# Altium footprint library ICs And Semiconductors THD.PcbLib: 507 footprints (part 27 of 32)
Each footprint in its own frame and in the unit in brackets; x right, y up, seen from the top. Pads: shape width x height; smd on the part's side, far side on the other; paste and mask are expansions set on the pad; w line width, h text height; cw(c..) or ccw(c..) is an arc to the next point about the centre after c.
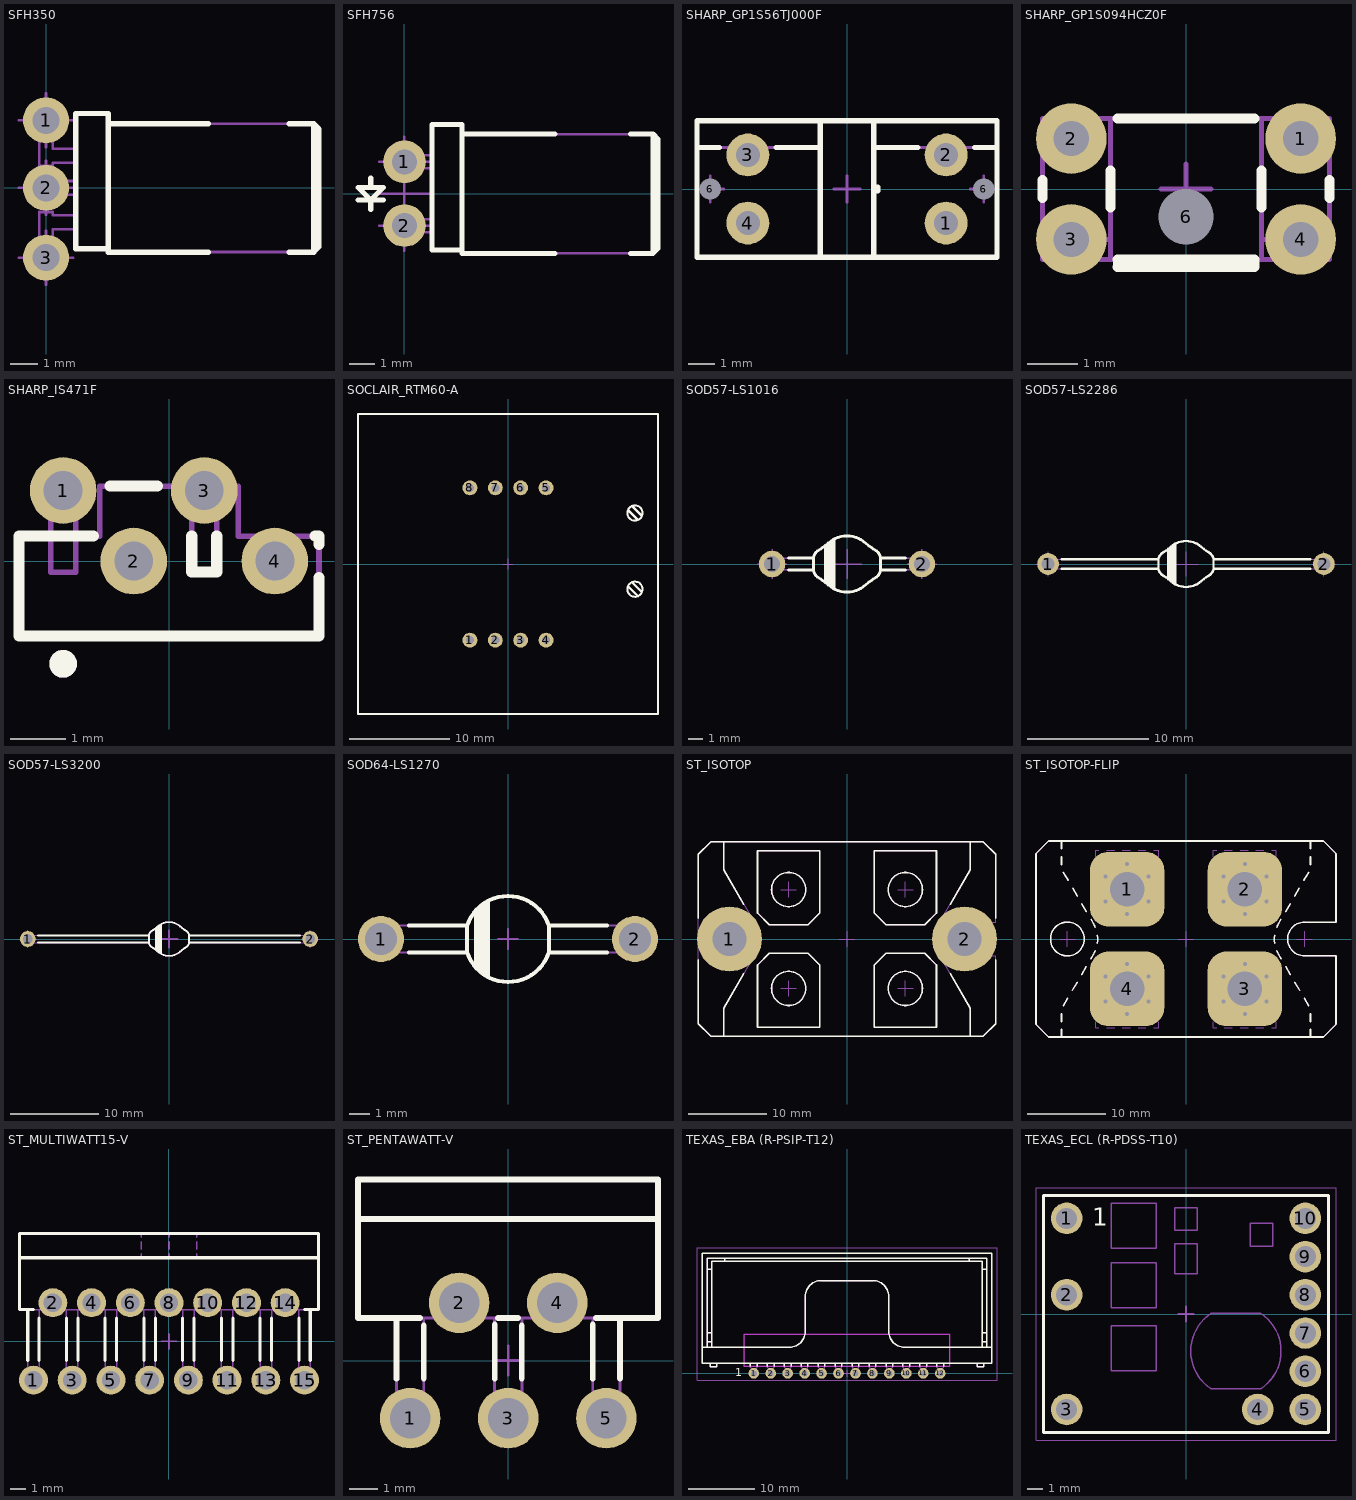
[diagram p26: the footprints below, top view; thin cyan lines are the x and y axes]

## SFH350 [mm] "Fiber Optic Phototransistor Detector"
height 7.55
pads (3):
  round 1.7 hole 1: 1(0,2.498) 2(0,0) 3(0,-2.582)
Top Overlay:
  lines w0.2: 2.3,-2.25 1.1,-2.25 1.1,2.75 2.3,2.75 2.3,-2.375 6,-2.375 ; 2.3,2.375 6,2.375 ; 9,-2.375 9.9,-2.375 ; 9,2.375 9.9,2.375 ; 9.9,-2.375 10.1,-2.175 10.1,2.175 9.9,2.375 ; 9.9,-2.375 9.9,2.375
Notvisible:
  lines w0.1: -1,-2.582 0,-2.582 ; -1,0 0,0 ; -1,2.498 0,2.498 ; 0,-3.582 0,-2.582 ; 0,-1.582 0,-2.582 ; 0,-1 0,0 ; 0,1 0,0 ; 0,1.498 0,2.498 ; 0,3.498 0,2.498 ; 1,-2.582 0,-2.582 ; 1,0 0,0 ; 1,2.498 0,2.498
Mechanical 14:
  lines w0.1: -0.25,-2.326 0.25,-2.326 ; -0.25,-1.526 -0.25,-1.014 ; 1.1,-1.526 0.25,-1.526 0.25,-2.961 -0.25,-2.961 -0.25,-0.891 0.25,-0.891 0.25,-1.014 1.1,-1.014 ; 1.1,-0.256 0.25,-0.256 0.25,-0.379 -0.25,-0.379 -0.25,0.379 0.25,0.379 0.25,0.256 1.1,0.256 ; 1.1,0.93 0.25,0.93 0.25,0.807 -0.25,0.807 -0.25,2.877 0.25,2.877 0.25,1.443 1.1,1.443 ; 2.3,-2.25 1.1,-2.25 1.1,2.75 2.3,2.75 2.3,-2.375 9.9,-2.375 ; 2.3,2.375 9.9,2.375 ; 9.9,-2.375 10.1,-2.175 10.1,2.175 9.9,2.375 ; 9.9,-2.375 9.9,2.375
3D body "SFH350.stp": height 7.54, standoff -3.2, extent -0.25,-2.961 10.1,2.877

## SFH756 [mm] "Fiber Optic Photodiode Detector"
height 7.55
pads (2):
  round 1.7 hole 1: 1(0,1.27) 2(0,-1.27)
Top Overlay:
  lines w0.2: -1.852,-0.254 -0.836,-0.254 ; -1.344,-0.635 -1.344,-0.254 ; -1.344,0.254 -1.344,0.635 ; 2.3,-2.25 1.1,-2.25 1.1,2.75 2.3,2.75 2.3,-2.375 6,-2.375 ; 2.3,2.375 6,2.375 ; 9,-2.375 9.9,-2.375 ; 9,2.375 9.9,2.375 ; -1.344,-0.254 -0.836,0.254 -1.852,0.254 -1.344,-0.254 ; 9.9,-2.375 9.9,2.375 ; 9.9,-2.375 10.1,-2.175 10.1,2.175 9.9,2.375
Notvisible:
  lines w0.1: -1,-1.27 0,-1.27 ; -1,0 0,0 ; -1,1.27 0,1.27 ; 0,-2.27 0,-1.27 ; 0,-1 0,0 ; 0,-0.27 0,-1.27 ; 0,0.27 0,1.27 ; 0,1 0,0 ; 0,2.27 0,1.27 ; 1,-1.27 0,-1.27 ; 1,0 0,0 ; 1,1.27 0,1.27
Mechanical 14:
  lines w0.1: -1.344,-0.635 -1.344,-0.254 ; -1.344,0.254 -1.344,0.635 ; 1.1,-1.526 -0.25,-1.526 -0.25,-1.014 1.1,-1.014 ; 1.1,1.014 -0.25,1.014 -0.25,1.526 1.1,1.526 ; 2.3,-2.25 1.1,-2.25 1.1,2.75 2.3,2.75 2.3,-2.375 9.9,-2.375 ; 2.3,2.375 9.9,2.375 ; -1.852,-0.254 -0.836,-0.254 ; -1.852,-0.254 -0.836,-0.254 ; -1.852,-0.254 -0.836,-0.254 ; -1.852,0.254 -0.836,0.254 ; -1.852,0.254 -1.344,-0.254 ; -1.852,0.254 -1.344,-0.254 ; -1.852,0.254 -0.836,0.254 ; -1.852,0.254 -0.836,0.254 ; -1.852,0.254 -1.344,-0.254 ; -1.344,-0.254 -0.836,0.254 ; -1.344,-0.254 -0.836,0.254 ; -1.344,-0.254 -0.836,0.254 ; 9.9,-2.375 9.9,2.375 ; 9.9,-2.375 10.1,-2.175 10.1,2.175 9.9,2.375
3D body "SFH756.stp": height 7.55, standoff -3.2, extent -0.25,-2.375 10.1,2.75

## SHARP_GP1S56TJ000F [mm] "Gap : 2mm, Slit : 0.15mm Phototransistor Output, Case package Transmissive Photointerrupter"
height 8.2
pads (6):
  round 1.6 hole 0.9: 1(3.7,-1.27) 2(3.7,1.27) 3(-3.7,1.27) 4(-3.7,-1.27)
  round 0.5 hole 0.8 unplated mask+0.15: 6(-5.1,0) 6(5.1,0)
Top Overlay:
  lines w0.2: -5.6,1.55 -4.764,1.55 ; -2.636,1.55 -1,1.55 ; -1,-2.55 -1,2.55 ; 1,-2.55 1,2.55 ; 1,-0.075 1.15,-0.075 1.15,0.075 1,0.075 ; 1,1.55 2.636,1.55 ; 4.764,1.55 5.6,1.55 ; -5.6,-2.55 -5.6,2.55 5.6,2.55 5.6,-2.55 -5.6,-2.55
Notvisible:
  lines w0.1: -5.6,0 -5.1,0 ; -5.1,-0.5 -5.1,0 ; -5.1,0.5 -5.1,0 ; -4.6,0 -5.1,0 ; -4.2,-1.27 -3.7,-1.27 ; -4.2,1.27 -3.7,1.27 ; -3.7,-1.77 -3.7,-1.27 ; -3.7,-0.77 -3.7,-1.27 ; -3.7,0.77 -3.7,1.27 ; -3.7,1.77 -3.7,1.27 ; -3.2,-1.27 -3.7,-1.27 ; -3.2,1.27 -3.7,1.27 ; -0.5,0 0,0 ; 0,-0.5 0,0 ; 0,0.5 0,0 ; 0.5,0 0,0 ; 3.2,-1.27 3.7,-1.27 ; 3.2,1.27 3.7,1.27 ; 3.7,-1.77 3.7,-1.27 ; 3.7,-0.77 3.7,-1.27 ; 3.7,0.77 3.7,1.27 ; 3.7,1.77 3.7,1.27 ; 4.2,-1.27 3.7,-1.27 ; 4.2,1.27 3.7,1.27 ; 4.6,0 5.1,0 ; 5.1,-0.5 5.1,0 ; 5.1,0.5 5.1,0 ; 5.6,0 5.1,0
Mechanical 14:
  lines w0.1: -5.6,1.55 -1,1.55 ; -1,-2.55 -1,2.55 ; 1,-2.55 1,2.55 ; 1,-0.075 1.15,-0.075 1.15,0.075 1,0.075 ; 1,1.55 5.6,1.55 ; -5.6,-2.55 -5.6,2.55 5.6,2.55 5.6,-2.55 -5.6,-2.55
3D body "SHARP_GP1S56TJ000F.stp": height 7.5, standoff -3.6, extent -5.6,-2.55 5.6,2.55

## SHARP_GP1S094HCZ0F [mm] "Gap : 3mm, Slit : 0.3mm Phototransistor Output, Compact Transmissive Photointerrupter"
height 4.8
pads (5):
  round 1.4 hole 0.7: 1(2.275,1) 2(-2.275,1) 3(-2.275,-1) 4(2.275,-1)
  round 0.5 hole 1.1 unplated mask+0.3: 6(0,-0.55)
Top Overlay:
  lines w0.2: -2.85,-0.182 -2.85,0.182 ; -1.358,-1.4 1.358,-1.4 1.358,-1.55 -1.358,-1.55 -1.35,-1.55 -1.35,-1.4 ; 1.5,-0.368 1.5,0.368 ; -1.5,-0.368 -1.5,0.368 -1.5,-0.368 ; -1.358,1.4 1.358,1.4 -1.358,1.4 ; 2.85,-0.182 2.85,0.182 2.85,-0.182
Notvisible:
  lines w0.1: -2.775,-1 -2.275,-1 ; -2.775,1 -2.275,1 ; -2.275,-1.5 -2.275,-1 ; -2.275,-0.5 -2.275,-1 ; -2.275,0.5 -2.275,1 ; -2.275,1.5 -2.275,1 ; -1.775,-1 -2.275,-1 ; -1.775,1 -2.275,1 ; -0.5,-0.55 0,-0.55 ; -0.5,0 0,0 ; 0,-1.05 0,-0.55 ; 0,0.5 0,0 ; 0.5,-0.55 0,-0.55 ; 0.5,0 0,0 ; 1.775,-1 2.275,-1 ; 1.775,1 2.275,1 ; 2.275,-1.5 2.275,-1 ; 2.275,-0.5 2.275,-1 ; 2.275,0.5 2.275,1 ; 2.275,1.5 2.275,1 ; 2.775,-1 2.275,-1 ; 2.775,1 2.275,1
Mechanical 14:
  lines w0.1: -2.85,-1 -1.5,-1 ; 1.5,-1.4 1.5,1.4 ; 1.5,-1 2.85,-1 ; -2.85,-1.4 -2.85,1.4 ; -2.85,-1.4 2.85,-1.4 ; -2.85,-1.4 -2.85,1.4 ; -2.85,-1.4 2.85,-1.4 ; -2.85,1.4 2.85,1.4 ; -2.85,1.4 2.85,1.4 ; 2.85,-1.4 2.85,1.4 ; 2.85,-1.4 2.85,1.4 ; -1.5,-1.4 -1.5,1.4 -1.5,-1.4
3D body "SHARP_GP1S094HCZ0F.stp": height 4.8, standoff -3.2, extent -2.85,-1.4 2.85,1.4

## SHARP_IS471F [mm] "SHARP OPIC Light Detector, 4-Leads, Pitch 1.27mm"
height 8.67
pads (4):
  round 1.2 hole 0.7: 1(-1.905,1.27) 2(-0.635,0) 3(0.635,1.27) 4(1.905,0)
Top Overlay:
  circle w0.25: c-1.905,-1.85 r0.125
  lines w0.2: -1.356,0.45 -2.7,0.45 -2.7,-1.35 2.7,-1.35 2.7,-0.301 ; -1.059,1.35 -0.211,1.35 ; 0.41,0.45 0.41,-0.2 0.86,-0.2 0.86,0.45 ; 2.626,0.45 2.7,0.45 2.7,0.301
Mechanical 14:
  circle w0.25: c-1.905,-1.85 r0.125
  lines w0.1: -2.7,-1.35 2.7,-1.35 2.7,0.45 1.25,0.45 1.25,1.35 -1.25,1.35 -1.25,0.45 -2.7,0.45 -2.7,-1.35 ; -2.13,-0.2 -1.68,-0.2 -1.68,1.47 -2.13,1.47 -2.13,-0.2 ; -0.86,-0.2 -0.41,-0.2 -0.41,0.2 -0.86,0.2 -0.86,-0.2 ; 0.41,-0.2 0.86,-0.2 0.86,1.47 0.41,1.47 0.41,-0.2 ; 1.68,-0.2 2.13,-0.2 2.13,0.2 1.68,0.2 1.68,-0.2
3D body "SHARP_IS471F.stp": height 8.17, standoff -3.35, extent -2.7,-1.35 2.7,1.47

## SOCLAIR_RTM60-A [mm] "SOCLAIR RTM60 Transducer for Pt-100, Resistors"
height 15
pads (8):
  round 1.5 hole 0.8: 1(-3.81,-7.62) 2(-1.27,-7.62) 3(1.27,-7.62) 4(3.81,-7.62) 5(3.81,7.62) 6(1.27,7.62) 7(-1.27,7.62) 8(-3.81,7.62)
Top Overlay:
  circle w0.2: c12.7,-2.52 r0.76
  circle w0.2: c12.7,5.1 r0.76
  lines w0.2: 12.002,-2.218 13.002,-3.218 ; 12.002,5.402 13.002,4.402 ; 12.398,-1.822 13.398,-2.822 ; 12.398,5.798 13.398,4.798 ; -15,-15 -15,15 15,15 15,-15 -15,-15
Notvisible:
  lines w0.1: -4.31,-7.62 -3.81,-7.62 ; -4.31,7.62 -3.81,7.62 ; -3.81,-8.12 -3.81,-7.62 ; -3.81,-7.12 -3.81,-7.62 ; -3.81,7.12 -3.81,7.62 ; -3.81,8.12 -3.81,7.62 ; -3.31,-7.62 -3.81,-7.62 ; -3.31,7.62 -3.81,7.62 ; -1.77,-7.62 -1.27,-7.62 ; -1.77,7.62 -1.27,7.62 ; -1.27,-8.12 -1.27,-7.62 ; -1.27,-7.12 -1.27,-7.62 ; -1.27,7.12 -1.27,7.62 ; -1.27,8.12 -1.27,7.62 ; -0.77,-7.62 -1.27,-7.62 ; -0.77,7.62 -1.27,7.62 ; -0.5,0 0,0 ; 0,-0.5 0,0 ; 0,0.5 0,0 ; 0.5,0 0,0 ; 0.77,-7.62 1.27,-7.62 ; 0.77,7.62 1.27,7.62 ; 1.27,-8.12 1.27,-7.62 ; 1.27,-7.12 1.27,-7.62 ; 1.27,7.12 1.27,7.62 ; 1.27,8.12 1.27,7.62 ; 1.77,-7.62 1.27,-7.62 ; 1.77,7.62 1.27,7.62 ; 3.31,-7.62 3.81,-7.62 ; 3.31,7.62 3.81,7.62 ; 3.81,-8.12 3.81,-7.62 ; 3.81,-7.12 3.81,-7.62 ; 3.81,7.12 3.81,7.62 ; 3.81,8.12 3.81,7.62 ; 4.31,-7.62 3.81,-7.62 ; 4.31,7.62 3.81,7.62
Mechanical 14:
  circle w0.1: c12.7,-2.52 r0.76
  circle w0.1: c12.7,5.1 r0.76
  lines w0.1: 12.002,-2.218 13.002,-3.218 ; 12.002,5.402 13.002,4.402 ; 12.398,-1.822 13.398,-2.822 ; 12.398,5.798 13.398,4.798 ; -15,-15 -15,15 15,15 15,-15 -15,-15
3D body "SOCLAIR_RTM60-A.stp": height 15, standoff -3.6, extent -15,-15 15,15

## SOD57-LS1016 [mm] "Diode, Axial, Body L 4.57 x D 3.81 mm , Pin spacing 10.16mm"
height 2
pads (2):
  round 1.8 hole 1.1: 1(-5.08,0) 2(5.08,0)
Top Overlay:
  lines w0.2: -3.95,-0.4 -2.28,-0.4 ; -3.95,0.4 -2.28,0.4 ; -1.474,-1.244 -1.474,1.244 ; -1.274,-1.41 -1.274,1.41 ; -1.074,-1.568 -1.074,1.568 ; -0.874,-1.689 -0.874,1.689 ; 3.95,-0.4 2.28,-0.4 ; 3.95,0.4 2.28,0.4 ; -2.28,-0.4 ccw(c-1.512,-0.28) -1.883,-0.962 cw(c-2.839,-2.719) -1.681,-1.089 cw(c-4.575,-5.166) -1.26,-1.423 ccw(c0,0) -0.92,-1.663 -0.813,-1.723 ccw(c0,0) 0,-1.905 ccw(c0,0) 0.813,-1.723 0.92,-1.663 ccw(c0,0) 1.26,-1.423 cw(c4.575,-5.166) 1.681,-1.089 cw(c2.839,-2.719) 1.883,-0.962 ccw(c1.512,-0.28) 2.28,-0.4 ; -2.28,-0.4 -2.28,0 -2.28,0.4 ; -2.28,0.4 cw(c-1.512,0.28) -1.883,0.962 ccw(c-2.839,2.719) -1.681,1.089 ccw(c-4.575,5.166) -1.26,1.423 cw(c0,0) -0.92,1.663 -0.813,1.723 cw(c0,0) 0,1.905 cw(c0,0) 0.813,1.723 0.92,1.663 cw(c0,0) 1.26,1.423 ccw(c4.575,5.166) 1.681,1.089 ccw(c2.839,2.719) 1.883,0.962 cw(c1.512,0.28) 2.28,0.4 ; 2.28,-0.4 2.28,0 2.28,0.4
Notvisible:
  lines w0.1: -6.08,0 -5.08,0 ; -5.08,-1 -5.08,0 ; -5.08,1 -5.08,0 ; -4.08,0 -5.08,0 ; -1,0 0,0 ; 0,-1 0,0 ; 0,1 0,0 ; 1,0 0,0 ; 4.08,0 5.08,0 ; 5.08,-1 5.08,0 ; 5.08,1 5.08,0 ; 6.08,0 5.08,0
Mechanical 14:
  lines w0.1: -1.474,-1.244 -1.474,1.244 ; -1.274,-1.41 -1.274,1.41 ; -1.074,-1.568 -1.074,1.568 ; -0.874,-1.689 -0.874,1.689 ; -2.28,-0.4 ccw(c-1.512,-0.28) -1.883,-0.962 cw(c-2.839,-2.719) -1.681,-1.089 cw(c-4.575,-5.166) -1.26,-1.423 ccw(c0,0) -0.92,-1.663 -0.813,-1.723 ccw(c0,0) 0,-1.905 ccw(c0,0) 0.813,-1.723 0.92,-1.663 ccw(c0,0) 1.26,-1.423 cw(c4.575,-5.166) 1.681,-1.089 cw(c2.839,-2.719) 1.883,-0.962 ccw(c1.512,-0.28) 2.28,-0.4 ; -2.28,-0.4 -5.08,-0.4 cw(c-5.08,0) -5.08,0.4 -2.28,0.4 ; -2.28,-0.4 -2.28,0 -2.28,0.4 ; -2.28,0.4 cw(c-1.512,0.28) -1.883,0.962 ccw(c-2.839,2.719) -1.681,1.089 ccw(c-4.575,5.166) -1.26,1.423 cw(c0,0) -0.92,1.663 -0.813,1.723 cw(c0,0) 0,1.905 cw(c0,0) 0.813,1.723 0.92,1.663 cw(c0,0) 1.26,1.423 ccw(c4.575,5.166) 1.681,1.089 ccw(c2.839,2.719) 1.883,0.962 cw(c1.512,0.28) 2.28,0.4 ; 2.28,-0.4 5.08,-0.4 ccw(c5.08,0) 5.08,0.4 2.28,0.4 ; 2.28,-0.4 2.28,0 2.28,0.4
3D body "SOD57-LS1016.stp": height 3.91, standoff -3, extent -5.475,-1.905 5.475,1.905

## SOD57-LS2286 [mm] "Diode, Axial, Body L 4.57 x D 3.81 mm , Pin spacing 22.86mm"
height 2
pads (2):
  round 1.8 hole 1.1: 1(-11.43,0) 2(11.43,0)
Top Overlay:
  lines w0.2: -10.3,-0.4 -2.28,-0.4 ; -10.3,0.4 -2.28,0.4 ; -1.474,-1.244 -1.474,1.244 ; -1.274,-1.41 -1.274,1.41 ; -1.074,-1.568 -1.074,1.568 ; -0.874,-1.689 -0.874,1.689 ; 10.3,-0.4 2.28,-0.4 ; 10.3,0.4 2.28,0.4 ; -2.28,-0.4 ccw(c-1.512,-0.28) -1.883,-0.962 cw(c-2.839,-2.719) -1.681,-1.089 cw(c-4.575,-5.166) -1.26,-1.423 ccw(c0,0) -0.92,-1.663 -0.813,-1.723 ccw(c0,0) 0,-1.905 ccw(c0,0) 0.813,-1.723 0.92,-1.663 ccw(c0,0) 1.26,-1.423 cw(c4.575,-5.166) 1.681,-1.089 cw(c2.839,-2.719) 1.883,-0.962 ccw(c1.512,-0.28) 2.28,-0.4 ; -2.28,-0.4 -2.28,0 -2.28,0.4 ; -2.28,0.4 cw(c-1.512,0.28) -1.883,0.962 ccw(c-2.839,2.719) -1.681,1.089 ccw(c-4.575,5.166) -1.26,1.423 cw(c0,0) -0.92,1.663 -0.813,1.723 cw(c0,0) 0,1.905 cw(c0,0) 0.813,1.723 0.92,1.663 cw(c0,0) 1.26,1.423 ccw(c4.575,5.166) 1.681,1.089 ccw(c2.839,2.719) 1.883,0.962 cw(c1.512,0.28) 2.28,0.4 ; 2.28,-0.4 2.28,0 2.28,0.4
Notvisible:
  lines w0.1: -12.43,0 -11.43,0 ; -11.43,-1 -11.43,0 ; -11.43,1 -11.43,0 ; -10.43,0 -11.43,0 ; -1,0 0,0 ; 0,-1 0,0 ; 0,1 0,0 ; 1,0 0,0 ; 10.43,0 11.43,0 ; 11.43,-1 11.43,0 ; 11.43,1 11.43,0 ; 12.43,0 11.43,0
Mechanical 14:
  lines w0.1: -1.474,-1.244 -1.474,1.244 ; -1.274,-1.41 -1.274,1.41 ; -1.074,-1.568 -1.074,1.568 ; -0.874,-1.689 -0.874,1.689 ; -2.28,-0.4 ccw(c-1.512,-0.28) -1.883,-0.962 cw(c-2.839,-2.719) -1.681,-1.089 cw(c-4.575,-5.166) -1.26,-1.423 ccw(c0,0) -0.92,-1.663 -0.813,-1.723 ccw(c0,0) 0,-1.905 ccw(c0,0) 0.813,-1.723 0.92,-1.663 ccw(c0,0) 1.26,-1.423 cw(c4.575,-5.166) 1.681,-1.089 cw(c2.839,-2.719) 1.883,-0.962 ccw(c1.512,-0.28) 2.28,-0.4 ; -2.28,-0.4 -2.28,0 -2.28,0.4 ; -2.28,-0.4 -11.43,-0.4 cw(c-11.43,0) -11.43,0.4 -2.28,0.4 ; -2.28,0.4 cw(c-1.512,0.28) -1.883,0.962 ccw(c-2.839,2.719) -1.681,1.089 ccw(c-4.575,5.166) -1.26,1.423 cw(c0,0) -0.92,1.663 -0.813,1.723 cw(c0,0) 0,1.905 cw(c0,0) 0.813,1.723 0.92,1.663 cw(c0,0) 1.26,1.423 ccw(c4.575,5.166) 1.681,1.089 ccw(c2.839,2.719) 1.883,0.962 cw(c1.512,0.28) 2.28,0.4 ; 2.28,-0.4 2.28,0 2.28,0.4 ; 2.28,-0.4 11.43,-0.4 ccw(c11.43,0) 11.43,0.4 2.28,0.4
3D body "SOD57-LS2286.stp": height 3.91, standoff -3, extent -11.825,-1.905 11.825,1.905

## SOD57-LS3200 [mm] "Diode, Axial, Body L 4.57 x D 3.81 mm , Pin spacing 32mm"
height 2
pads (2):
  round 1.8 hole 1.1: 1(-16,0) 2(16,0)
Top Overlay:
  lines w0.2: -14.87,-0.4 -2.28,-0.4 ; -14.87,0.4 -2.28,0.4 ; -1.474,-1.244 -1.474,1.244 ; -1.274,-1.41 -1.274,1.41 ; -1.074,-1.568 -1.074,1.568 ; -0.874,-1.689 -0.874,1.689 ; 14.87,-0.4 2.28,-0.4 ; 14.87,0.4 2.28,0.4 ; -2.28,-0.4 ccw(c-1.512,-0.28) -1.883,-0.962 cw(c-2.839,-2.719) -1.681,-1.089 cw(c-4.575,-5.166) -1.26,-1.423 ccw(c0,0) -0.92,-1.663 -0.813,-1.723 ccw(c0,0) 0,-1.905 ccw(c0,0) 0.813,-1.723 0.92,-1.663 ccw(c0,0) 1.26,-1.423 cw(c4.575,-5.166) 1.681,-1.089 cw(c2.839,-2.719) 1.883,-0.962 ccw(c1.512,-0.28) 2.28,-0.4 ; -2.28,-0.4 -2.28,0 -2.28,0.4 ; -2.28,0.4 cw(c-1.512,0.28) -1.883,0.962 ccw(c-2.839,2.719) -1.681,1.089 ccw(c-4.575,5.166) -1.26,1.423 cw(c0,0) -0.92,1.663 -0.813,1.723 cw(c0,0) 0,1.905 cw(c0,0) 0.813,1.723 0.92,1.663 cw(c0,0) 1.26,1.423 ccw(c4.575,5.166) 1.681,1.089 ccw(c2.839,2.719) 1.883,0.962 cw(c1.512,0.28) 2.28,0.4 ; 2.28,-0.4 2.28,0 2.28,0.4
Notvisible:
  lines w0.1: -17,0 -16,0 ; -16,-1 -16,0 ; -16,1 -16,0 ; -15,0 -16,0 ; 15,0 16,0 ; 16,-1 16,0 ; 16,1 16,0 ; 17,0 16,0
  lines w0.2: -1,0 0,0 ; 0,-1 0,0 ; 0,1 0,0 ; 1,0 0,0
Mechanical 14:
  lines w0.1: -2.28,-0.4 -16,-0.4 cw(c-16,0) -16,0.4 -2.28,0.4 ; 2.28,-0.4 16,-0.4 ccw(c16,0) 16,0.4 2.28,0.4
  lines w0.2: -1.474,-1.244 -1.474,1.244 ; -1.274,-1.41 -1.274,1.41 ; -1.074,-1.568 -1.074,1.568 ; -0.874,-1.689 -0.874,1.689 ; -2.28,-0.4 ccw(c-1.512,-0.28) -1.883,-0.962 cw(c-2.839,-2.719) -1.681,-1.089 cw(c-4.575,-5.166) -1.26,-1.423 ccw(c0,0) -0.92,-1.663 -0.813,-1.723 ccw(c0,0) 0,-1.905 ccw(c0,0) 0.813,-1.723 0.92,-1.663 ccw(c0,0) 1.26,-1.423 cw(c4.575,-5.166) 1.681,-1.089 cw(c2.839,-2.719) 1.883,-0.962 ccw(c1.512,-0.28) 2.28,-0.4 2.28,0 2.28,0.4 ccw(c1.512,0.28) 1.883,0.962 cw(c2.839,2.719) 1.681,1.089 cw(c4.575,5.166) 1.26,1.423 ccw(c0,0) 0.92,1.663 0.813,1.723 ccw(c0,0) 0,1.905 ccw(c0,0) -0.813,1.723 -0.92,1.663 ccw(c0,0) -1.26,1.423 cw(c-4.575,5.166) -1.681,1.089 cw(c-2.839,2.719) -1.883,0.962 ccw(c-1.512,0.28) -2.28,0.4 -2.28,0 -2.28,-0.4
3D body "SOD57-LS3200.stp": height 3.91, standoff -3, extent -16.395,-1.905 16.395,1.905

## SOD64-LS1270 [mm] "Diode, Axial, Body L 4 x D 4.3mm , Pin spacing 12.7mm"
height 4.85
pads (2):
  round 2.3 hole 1.6: 1(-6.35,0) 2(6.35,0)
Top Overlay:
  lines w0.2: -4.955,-0.675 -2.041,-0.675 ; -4.955,0.675 -2.041,0.675 ; -1.6,-1.436 -1.6,1.436 ; -1.4,-1.632 -1.4,1.632 ; -1.2,-1.784 -1.2,1.784 ; -1,-1.903 -1,1.903 ; 4.955,-0.675 2.041,-0.675 ; 4.955,0.675 2.041,0.675 ; -2.041,-0.675 ccw(c0,0) 2.041,-0.675 ; -2.041,-0.675 -2.041,0.675 ; -2.041,0.675 cw(c0,0) 2.041,0.675 ; 2.041,-0.675 2.041,0.675
Notvisible:
  lines w0.1: -6.85,0 -6.35,0 ; -6.35,-0.5 -6.35,0 ; -6.35,0.5 -6.35,0 ; -5.85,0 -6.35,0 ; -0.5,0 0,0 ; 0,-0.5 0,0 ; 0,0.5 0,0 ; 0.5,0 0,0 ; 5.85,0 6.35,0 ; 6.35,-0.5 6.35,0 ; 6.35,0.5 6.35,0 ; 6.85,0 6.35,0
Mechanical 14:
  lines w0.1: -1.6,-1.436 -1.6,1.436 ; -1.4,-1.632 -1.4,1.632 ; -1.2,-1.784 -1.2,1.784 ; -1,-1.903 -1,1.903 ; -2.041,-0.675 ccw(c0,0) 2.041,-0.675 ; -2.041,-0.675 -2.041,0.675 ; -2.041,-0.675 -6.35,-0.675 cw(c-6.35,0) -6.35,0.675 -2.041,0.675 ; -2.041,0.675 cw(c0,0) 2.041,0.675 ; 2.041,-0.675 6.35,-0.675 ccw(c6.35,0) 6.35,0.675 2.041,0.675 ; 2.041,-0.675 2.041,0.675
3D body "SOD64-LS1270.stp": height 4.85, standoff -2.65, extent -7.025,-2.15 7.025,2.15

## ST_ISOTOP [mm] "STMicroelectronics isotop Case, Body 38mm x 25.5mm, Tab on PCB Version"
height 12.2
pads (2):
  round 8.35 hole 4.4: 1(-15.1,0) 2(15.1,0)
Top Overlay:
  circle w0.2: c-7.5,6.35 r2.2
  circle w0.2: c7.5,6.35 r2.2
  circle w0.2: c7.5,-6.35 r2.2
  circle w0.2: c-7.5,-6.35 r2.2
  lines w0.2: -19.1,-2.698 -19.1,-10.879 -17.5,-12.479 -15.85,-12.479 ; -19.1,2.698 -19.1,10.879 -17.5,12.479 -15.85,12.479 ; -13.247,-4.455 -15.85,-8.9 -15.85,-12.479 ; -13.247,4.455 -15.85,8.9 -15.85,12.479 ; 13.247,-4.455 15.85,-8.9 15.85,-12.479 ; 13.247,4.455 15.85,8.9 15.85,12.479 ; 19.1,-2.698 19.1,-10.879 17.5,-12.479 15.85,-12.479 ; 19.1,2.698 19.1,10.879 17.5,12.479 15.85,12.479 ; -15.85,-12.479 15.85,-12.479 ; -15.85,12.479 15.85,12.479 ; -11.5,-11.314 -3.5,-11.314 -3.5,-3.342 ; -11.5,-11.314 -11.5,-3.342 ; -11.5,-11.314 -11.5,-3.342 ; -11.5,-3.342 -10,-1.842 ; -11.5,-3.342 -10,-1.842 ; -10,-1.842 -5,-1.842 ; -10,-1.842 -5,-1.842 ; -5,-1.842 -3.5,-3.342 ; -5,-1.842 -3.5,-3.342 ; -11.5,3.342 -10,1.842 -5,1.842 -3.5,3.342 -3.5,11.314 -11.5,11.314 -11.5,3.342 ; 3.5,-11.314 11.5,-11.314 11.5,-3.342 10,-1.842 5,-1.842 3.5,-3.342 3.5,-11.314 ; 3.5,3.342 5,1.842 10,1.842 11.5,3.342 11.5,11.314 3.5,11.314 3.5,3.342
Notvisible:
  lines w0.1: -16.1,0 -15.1,0 ; -15.1,-1 -15.1,0 ; -15.1,1 -15.1,0 ; -14.1,0 -15.1,0 ; -8.5,-6.35 -7.5,-6.35 ; -8.5,6.35 -7.5,6.35 ; -7.5,-7.35 -7.5,-6.35 ; -7.5,-5.35 -7.5,-6.35 ; -7.5,5.35 -7.5,6.35 ; -7.5,7.35 -7.5,6.35 ; -6.5,-6.35 -7.5,-6.35 ; -6.5,6.35 -7.5,6.35 ; -1,0 0,0 ; 0,-1 0,0 ; 0,1 0,0 ; 1,0 0,0 ; 6.5,-6.35 7.5,-6.35 ; 6.5,6.35 7.5,6.35 ; 7.5,-7.35 7.5,-6.35 ; 7.5,-5.35 7.5,-6.35 ; 7.5,5.35 7.5,6.35 ; 7.5,7.35 7.5,6.35 ; 8.5,-6.35 7.5,-6.35 ; 8.5,6.35 7.5,6.35 ; 14.1,0 15.1,0 ; 15.1,-1 15.1,0 ; 15.1,1 15.1,0 ; 16.1,0 15.1,0
Mechanical 14:
  circle w0.1: c-7.5,6.35 r2.2
  circle w0.1: c7.5,6.35 r2.2
  circle w0.1: c7.5,-6.35 r2.2
  circle w0.1: c-7.5,-6.35 r2.2
  circle w0.1: c-15.1,0 r2.15
  lines w0.1: -15.85,-12.479 -17.5,-12.479 -19.1,-10.879 -19.1,10.879 -17.5,12.479 -15.85,12.479 ; -15.85,-12.479 15.85,-12.479 ; -15.85,-12.479 -15.85,-8.9 -11.778,-1.945 ccw(c-15.1,0) -11.778,1.945 -15.85,8.9 -15.85,12.479 ; -15.85,12.479 17.5,12.479 ; -11.5,-11.314 -3.5,-11.314 -3.5,-3.342 ; -11.5,-11.314 -11.5,-3.342 ; -11.5,-11.314 -11.5,-3.342 ; -11.5,-3.342 -10,-1.842 ; -11.5,-3.342 -10,-1.842 ; -10,-1.842 -5,-1.842 ; -10,-1.842 -5,-1.842 ; -5,-1.842 -3.5,-3.342 ; -5,-1.842 -3.5,-3.342 ; 15.85,-12.479 17.5,-12.479 19.1,-10.879 19.1,-2.15 15.1,-2.15 cw(c15.1,0) 15.1,2.15 19.1,2.15 19.1,10.879 17.5,12.479 ; 15.85,-12.479 15.85,-8.9 11.778,-1.945 cw(c15.1,0) 11.778,1.945 15.85,8.9 15.85,12.479 17.5,12.479 ; -11.5,3.342 -10,1.842 -5,1.842 -3.5,3.342 -3.5,11.314 -11.5,11.314 -11.5,3.342 ; 3.5,-11.314 11.5,-11.314 11.5,-3.342 10,-1.842 5,-1.842 3.5,-3.342 3.5,-11.314 ; 3.5,3.342 5,1.842 10,1.842 11.5,3.342 11.5,11.314 3.5,11.314 3.5,3.342
3D body "ISOTOP.stp": height 12.04, standoff 0, extent -19.1,-12.479 19.1,12.479

## ST_ISOTOP-FLIP [mm] "STMicroelectronics isotop Case, Body 38mm x 25.5mm, Screws on PCB Version"
height 12.2
pads (4):
  rrect50% 9.5x9.5 hole 4.4: 1(-7.5,6.35) 2(7.5,6.35) 3(7.5,-6.35) 4(-7.5,-6.35)
via -4.75,-4.763 diameter 1 hole 0.5
via -7.5,-3.175 diameter 1 hole 0.5
via -10.25,-4.763 diameter 1 hole 0.5
via -10.25,-7.938 diameter 1 hole 0.5
via -7.5,-9.525 diameter 1 hole 0.5
via -4.75,-7.938 diameter 1 hole 0.5
via 10.25,-4.763 diameter 1 hole 0.5
via 7.5,-3.175 diameter 1 hole 0.5
via 4.75,-4.763 diameter 1 hole 0.5
via 4.75,-7.938 diameter 1 hole 0.5
via 7.5,-9.525 diameter 1 hole 0.5
via 10.25,-7.938 diameter 1 hole 0.5
via -4.75,7.938 diameter 1 hole 0.5
via -7.5,9.525 diameter 1 hole 0.5
via -10.25,7.938 diameter 1 hole 0.5
via -10.25,4.763 diameter 1 hole 0.5
via -7.5,3.175 diameter 1 hole 0.5
via -4.75,4.763 diameter 1 hole 0.5
via 10.25,7.938 diameter 1 hole 0.5
via 7.5,9.525 diameter 1 hole 0.5
via 4.75,7.938 diameter 1 hole 0.5
via 4.75,4.763 diameter 1 hole 0.5
via 7.5,3.175 diameter 1 hole 0.5
via 10.25,4.763 diameter 1 hole 0.5
Top Overlay:
  circle w0.2: c-15.1,0 r2.15
  lines w0.2: -15.85,-11.521 -15.85,-12.479 ; -15.85,-10.521 -15.85,-9.521 ; -15.85,9.479 -15.85,10.479 ; -15.85,11.479 -15.85,12.479 ; -15.628,-8.521 -15.043,-7.521 ; -15.603,8.479 -15.018,7.479 ; -14.457,-6.521 -13.871,-5.521 ; -14.432,6.479 -13.847,5.479 ; -13.286,-4.521 -12.7,-3.521 ; -13.261,4.479 -12.676,3.479 ; -12.115,-2.521 -11.778,-1.945 ccw(c-15.1,0) -11.563,-1.521 ; -12.09,2.479 -11.778,1.945 cw(c-15.1,0) -11.545,1.479 ; -11.285,-0.521 ccw(c-15.1,0) -11.28,0.479 ; 11.28,0.479 ccw(c15.1,0) 11.285,-0.521 ; 11.545,1.479 cw(c15.1,0) 11.778,1.945 12.09,2.479 ; 11.563,-1.521 ccw(c15.1,0) 11.778,-1.945 12.115,-2.521 ; 12.676,3.479 13.261,4.479 ; 12.7,-3.521 13.286,-4.521 ; 13.847,5.479 14.432,6.479 ; 13.871,-5.521 14.457,-6.521 ; 15.018,7.479 15.603,8.479 ; 15.043,-7.521 15.628,-8.521 ; 15.85,-11.521 15.85,-12.479 ; 15.85,-10.521 15.85,-9.521 ; 15.85,9.479 15.85,10.479 ; 15.85,11.479 15.85,12.479 ; -15.85,-12.479 -17.5,-12.479 -19.1,-10.879 -19.1,10.879 -17.5,12.479 -15.85,12.479 ; -15.85,-12.479 15.85,-12.479 ; -15.85,12.479 15.85,12.479 ; 15.1,-2.15 cw(c15.1,0) 15.1,2.15 ; 15.1,-2.15 19.1,-2.15 ; 15.1,-2.15 19.1,-2.15 ; 15.1,2.15 19.1,2.15 ; 15.1,2.15 19.1,2.15 ; 15.85,-12.479 17.5,-12.479 19.1,-10.879 19.1,-2.15 ; 15.85,12.479 17.5,12.479 19.1,10.879 19.1,2.15
Notvisible:
  lines w0.1: -15.1,0 -16.1,0 -15.1,0 ; -15.1,0 -14.1,0 -15.1,0 ; -15.1,0 -15.1,1 -15.1,0 ; -15.1,0 -15.1,-1 -15.1,0 ; -7.5,-6.35 -8.5,-6.35 -7.5,-6.35 ; -7.5,-6.35 -6.5,-6.35 -7.5,-6.35 ; -7.5,-6.35 -7.5,-5.35 -7.5,-6.35 ; -7.5,-6.35 -7.5,-7.35 -7.5,-6.35 ; -7.5,6.35 -8.5,6.35 -7.5,6.35 ; -7.5,6.35 -6.5,6.35 -7.5,6.35 ; -7.5,6.35 -7.5,7.35 -7.5,6.35 ; -7.5,6.35 -7.5,5.35 -7.5,6.35 ; 0,0 -1,0 0,0 ; 0,0 1,0 0,0 ; 0,0 0,1 0,0 ; 0,0 0,-1 0,0 ; 7.5,-6.35 6.5,-6.35 7.5,-6.35 ; 7.5,-6.35 8.5,-6.35 7.5,-6.35 ; 7.5,-6.35 7.5,-5.35 7.5,-6.35 ; 7.5,-6.35 7.5,-7.35 7.5,-6.35 ; 7.5,6.35 6.5,6.35 7.5,6.35 ; 7.5,6.35 8.5,6.35 7.5,6.35 ; 7.5,6.35 7.5,7.35 7.5,6.35 ; 7.5,6.35 7.5,5.35 7.5,6.35 ; 15.1,0 14.1,0 15.1,0 ; 15.1,0 16.1,0 15.1,0 ; 15.1,0 15.1,1 15.1,0 ; 15.1,0 15.1,-1 15.1,0
Mechanical 14:
  circle w0.1: c-15.1,0 r2.15
  circle w0.1: c-7.5,-6.35 r2.2
  circle w0.1: c7.5,-6.35 r2.2
  circle w0.1: c7.5,6.35 r2.2
  circle w0.1: c-7.5,6.35 r2.2
  lines w0.1: -15.85,-11.521 -15.85,-12.479 ; -15.85,-10.521 -15.85,-9.521 ; -15.85,9.479 -15.85,10.479 ; -15.85,11.479 -15.85,12.479 ; -15.628,-8.521 -15.043,-7.521 ; -15.603,8.479 -15.018,7.479 ; -14.457,-6.521 -13.871,-5.521 ; -14.432,6.479 -13.847,5.479 ; -13.286,-4.521 -12.7,-3.521 ; -13.261,4.479 -12.676,3.479 ; -12.115,-2.521 -11.778,-1.945 ccw(c-15.1,0) -11.563,-1.521 ; -12.09,2.479 -11.778,1.945 cw(c-15.1,0) -11.545,1.479 ; -11.5,-10.521 -11.5,-11.314 -11.1,-11.314 ; -11.5,-9.521 -11.5,-8.521 ; -11.5,-7.521 -11.5,-6.521 ; -11.5,-5.521 -11.5,-4.521 ; -11.5,-3.521 -11.5,-3.342 ; -11.5,3.479 -11.5,3.342 -10.637,2.479 ; -11.5,4.479 -11.5,5.479 ; -11.5,6.479 -11.5,7.479 ; -11.5,8.479 -11.5,9.479 ; -11.5,10.479 -11.5,11.314 -11.1,11.314 ; -11.285,-0.521 ccw(c-15.1,0) -11.28,0.479 ; -10.1,-11.314 -9.1,-11.314 ; -10.1,11.314 -9.1,11.314 ; -10,1.842 -9.1,1.842 ; -8.1,-11.314 -7.1,-11.314 ; -8.1,1.842 -7.1,1.842 ; -8.1,11.314 -7.1,11.314 ; -6.1,-11.314 -5.1,-11.314 ; -6.1,1.842 -5.1,1.842 ; -6.1,11.314 -5.1,11.314 ; -5.1,-1.842 -6.1,-1.842 -5,-1.842 ; -4.363,2.479 -3.5,3.342 -3.5,3.479 ; -4.1,-11.314 -3.5,-11.314 -3.5,-10.521 ; -4.1,11.314 -3.5,11.314 -3.5,10.479 ; -3.5,-9.521 -3.5,-8.521 ; -3.5,-7.521 -3.5,-6.521 ; -3.5,-5.521 -3.5,-4.521 ; -3.5,-3.521 -3.5,-3.342 ; -3.5,4.479 -3.5,5.479 ; -3.5,6.479 -3.5,7.479 ; -3.5,8.479 -3.5,9.479 ; 3.5,-10.521 3.5,-11.314 3.9,-11.314 ; 3.5,-9.521 3.5,-8.521 ; 3.5,-7.521 3.5,-6.521 ; 3.5,-5.521 3.5,-4.521 ; 3.5,-3.521 3.5,-3.342 4.321,-2.521 ; 3.5,3.479 3.5,3.342 4.363,2.479 ; 3.5,4.479 3.5,5.479 ; 3.5,6.479 3.5,7.479 ; 3.5,8.479 3.5,9.479 ; 3.5,10.479 3.5,11.314 3.9,11.314 ; 4.9,-11.314 5.9,-11.314 ; 4.9,11.314 5.9,11.314 ; 5,-1.842 5.9,-1.842 ; 5,1.842 5.9,1.842 ; 6.9,-11.314 7.9,-11.314 ; 6.9,-1.842 7.9,-1.842 ; 6.9,1.842 7.9,1.842 ; 6.9,11.314 7.9,11.314 ; 8.9,-11.314 9.9,-11.314 ; 8.9,-1.842 9.9,-1.842 ; 8.9,1.842 9.9,1.842 ; 8.9,11.314 9.9,11.314 ; 10.637,2.479 11.5,3.342 11.5,3.479 ; 10.679,-2.521 11.5,-3.342 11.5,-3.521 ; 10.9,-11.314 11.5,-11.314 11.5,-10.521 ; 10.9,11.314 11.5,11.314 11.5,10.479 ; 11.28,0.479 ccw(c15.1,0) 11.285,-0.521 ; 11.5,-9.521 11.5,-8.521 ; 11.5,-7.521 11.5,-6.521 ; 11.5,-5.521 11.5,-4.521 ; 11.5,4.479 11.5,5.479 ; 11.5,6.479 11.5,7.479 ; 11.5,8.479 11.5,9.479 ; 11.545,1.479 cw(c15.1,0) 11.778,1.945 12.09,2.479 ; 11.563,-1.521 ccw(c15.1,0) 11.778,-1.945 12.115,-2.521 ; 12.676,3.479 13.261,4.479 ; 12.7,-3.521 13.286,-4.521 ; 13.847,5.479 14.432,6.479 ; 13.871,-5.521 14.457,-6.521 ; 15.018,7.479 15.603,8.479 ; 15.043,-7.521 15.628,-8.521 ; 15.85,-11.521 15.85,-12.479 ; 15.85,-10.521 15.85,-9.521 ; 15.85,9.479 15.85,10.479 ; 15.85,11.479 15.85,12.479 ; -15.85,-12.479 15.85,-12.479 ; -15.85,-12.479 -17.5,-12.479 -19.1,-10.879 -19.1,10.879 -17.5,12.479 -15.85,12.479 ; -15.85,12.479 15.85,12.479 ; -11.5,-3.342 -10.679,-2.521 -11.5,-3.342 ; -3.5,-3.342 -4.321,-2.521 -3.5,-3.342 ; 15.1,-2.15 cw(c15.1,0) 15.1,2.15 ; 15.1,-2.15 19.1,-2.15 ; 15.1,-2.15 19.1,-2.15 ; 15.1,2.15 19.1,2.15 ; 15.1,2.15 19.1,2.15 ; 15.85,-12.479 17.5,-12.479 19.1,-10.879 19.1,-2.15 ; 15.85,12.479 17.5,12.479 19.1,10.879 19.1,2.15 ; -10,-1.842 -9.1,-1.842 -10,-1.842 ; -8.1,-1.842 -7.1,-1.842 -8.1,-1.842
3D body "ST_ISOTOP-Flip_Part2.stp": height 10.24, standoff -4.69, extent -11.5,-10.365 11.5,10.365
3D body "ST_ISOTOP-Flip_Part1.stp": height 12.04, standoff 0, extent -19.1,-12.479 19.1,12.479

## ST_MULTIWATT15-V [mm] "ST Microelectronic  15 Leads MULTIWATT Vertical Case"
height 21
pads (15):
  round 1.9 hole 1.2: 1(-8.89,-2.54) 2(-7.62,2.54) 3(-6.35,-2.54) 4(-5.08,2.54) 5(-3.81,-2.54) 6(-2.54,2.54) 7(-1.27,-2.54) 8(0,2.54) 9(1.27,-2.54) 10(2.54,2.54) 11(3.81,-2.54) 12(5.08,2.54) 13(6.35,-2.54) 14(7.62,2.54) 15(8.89,-2.54)
Top Overlay:
  lines w0.2: -9.8,5.49 9.8,5.49 ; -9.265,-1.243 -9.265,2.09 ; -8.893,2.09 -9.8,2.09 -9.8,7.09 0,7.09 9.8,7.09 9.8,2.09 8.893,2.09 ; -8.515,-1.243 -8.515,1.529 ; -6.725,-1.243 -6.725,1.529 ; -5.975,-1.243 -5.975,1.529 ; -4.185,-1.243 -4.185,1.529 ; -3.435,-1.243 -3.435,1.529 ; -1.645,-1.243 -1.645,1.529 ; -0.895,-1.243 -0.895,1.529 ; 0.895,-1.243 0.895,1.529 ; 1.645,-1.243 1.645,1.529 ; 3.435,-1.243 3.435,1.529 ; 4.185,-1.243 4.185,1.529 ; 5.975,-1.243 5.975,1.529 ; 6.725,-1.243 6.725,1.529 ; 8.515,-1.243 8.515,1.529 ; 9.265,-1.243 9.265,2.09
Notvisible:
  lines w0.1: -9.39,-2.54 -8.89,-2.54 ; -8.89,-3.04 -8.89,-2.54 ; -8.89,-2.04 -8.89,-2.54 ; -8.39,-2.54 -8.89,-2.54 ; -8.12,2.54 -7.62,2.54 ; -7.62,2.04 -7.62,2.54 ; -7.62,3.04 -7.62,2.54 ; -7.12,2.54 -7.62,2.54 ; -6.85,-2.54 -6.35,-2.54 ; -6.35,-3.04 -6.35,-2.54 ; -6.35,-2.04 -6.35,-2.54 ; -5.85,-2.54 -6.35,-2.54 ; -5.58,2.54 -5.08,2.54 ; -5.08,2.04 -5.08,2.54 ; -5.08,3.04 -5.08,2.54 ; -4.58,2.54 -5.08,2.54 ; -4.31,-2.54 -3.81,-2.54 ; -3.81,-3.04 -3.81,-2.54 ; -3.81,-2.04 -3.81,-2.54 ; -3.31,-2.54 -3.81,-2.54 ; -3.04,2.54 -2.54,2.54 ; -2.54,2.04 -2.54,2.54 ; -2.54,3.04 -2.54,2.54 ; -2.04,2.54 -2.54,2.54 ; -1.77,-2.54 -1.27,-2.54 ; -1.27,-3.04 -1.27,-2.54 ; -1.27,-2.04 -1.27,-2.54 ; -0.77,-2.54 -1.27,-2.54 ; -0.5,0 0,0 ; -0.5,2.54 0,2.54 ; 0,-0.5 0,0 ; 0,0.5 0,0 ; 0,2.04 0,2.54 ; 0,3.04 0,2.54 ; 0.5,0 0,0 ; 0.5,2.54 0,2.54 ; 0.77,-2.54 1.27,-2.54 ; 1.27,-3.04 1.27,-2.54 ; 1.27,-2.04 1.27,-2.54 ; 1.77,-2.54 1.27,-2.54 ; 2.04,2.54 2.54,2.54 ; 2.54,2.04 2.54,2.54 ; 2.54,3.04 2.54,2.54 ; 3.04,2.54 2.54,2.54 ; 3.31,-2.54 3.81,-2.54 ; 3.81,-3.04 3.81,-2.54 ; 3.81,-2.04 3.81,-2.54 ; 4.31,-2.54 3.81,-2.54 ; 4.58,2.54 5.08,2.54 ; 5.08,2.04 5.08,2.54 ; 5.08,3.04 5.08,2.54 ; 5.58,2.54 5.08,2.54 ; 5.85,-2.54 6.35,-2.54 ; 6.35,-3.04 6.35,-2.54 ; 6.35,-2.04 6.35,-2.54 ; 6.85,-2.54 6.35,-2.54 ; 7.12,2.54 7.62,2.54 ; 7.62,2.04 7.62,2.54 ; 7.62,3.04 7.62,2.54 ; 8.12,2.54 7.62,2.54 ; 8.39,-2.54 8.89,-2.54 ; 8.89,-3.04 8.89,-2.54 ; 8.89,-2.04 8.89,-2.54 ; 9.39,-2.54 8.89,-2.54
Mechanical 14:
  lines w0.1: -9.8,5.49 9.8,5.49 ; -9.265,2.09 -9.265,-2.815 -8.515,-2.816 -8.515,2.09 ; -6.725,2.09 -6.725,-2.815 -5.975,-2.816 -5.975,2.09 ; -4.185,2.09 -4.185,-2.815 -3.435,-2.816 -3.435,2.09 ; -1.825,5.49 -1.825,5.74 ; -1.825,6.04 -1.825,6.29 -1.825,6.54 ; -1.825,6.84 -1.825,7.09 ; -1.645,2.09 -1.645,-2.815 -0.895,-2.816 -0.895,2.09 ; 0,5.49 0,5.74 ; 0,6.04 0,6.29 0,6.54 ; 0,6.84 0,7.09 ; 0.895,2.09 0.895,-2.815 1.645,-2.816 1.645,2.09 ; 1.825,5.49 1.825,5.74 ; 1.825,6.04 1.825,6.29 1.825,6.54 ; 1.825,6.84 1.825,7.09 ; 3.435,2.09 3.435,-2.815 4.185,-2.816 4.185,2.09 ; 5.975,2.09 5.975,-2.815 6.725,-2.816 6.725,2.09 ; 8.515,2.09 8.515,-2.815 9.265,-2.816 9.265,2.09 ; 0,7.09 9.8,7.09 9.8,2.09 -9.8,2.09 -9.8,7.09 0,7.09
3D body "ST_MULTIWATT15-V.stp": height 20.75, standoff -4.4, extent -9.8,-2.815 9.8,7.09

## ST_PENTAWATT-V [mm] "ST Microelectronic  5 Leads PENTAWATT Verttical Case"
height 3.68
pads (5):
  round 2.1 hole 1.4: 1(-3.4,-2) 2(-1.7,2) 3(0,-2) 4(1.7,2) 5(3.4,-2)
Top Overlay:
  lines w0.2: -5.208,4.905 5.192,4.905 ; -3.871,-0.631 -3.871,1.475 ; -3.06,1.475 -5.208,1.475 -5.208,6.275 5.192,6.275 5.192,1.475 3.043,1.475 ; -2.929,-0.626 -2.929,1.218 ; -0.471,-0.631 -0.471,1.244 ; -0.357,1.475 0.34,1.475 ; 0.471,-0.626 0.471,1.218 ; 2.929,-0.631 2.929,1.244 ; 3.871,-0.626 3.871,1.475
Notvisible:
  lines w0.1: -3.9,-2 -3.4,-2 ; -3.4,-2.5 -3.4,-2 ; -3.4,-1.5 -3.4,-2 ; -2.9,-2 -3.4,-2 ; -2.2,2 -1.7,2 ; -1.7,1.5 -1.7,2 ; -1.7,2.5 -1.7,2 ; -1.2,2 -1.7,2 ; -0.5,-2 0,-2 ; -0.5,0 0,0 ; 0,-2.5 0,-2 ; 0,-1.5 0,-2 ; 0,-0.5 0,0 ; 0,0.5 0,0 ; 0.5,-2 0,-2 ; 0.5,0 0,0 ; 1.2,2 1.7,2 ; 1.7,1.5 1.7,2 ; 1.7,2.5 1.7,2 ; 2.2,2 1.7,2 ; 2.9,-2 3.4,-2 ; 3.4,-2.5 3.4,-2 ; 3.4,-1.5 3.4,-2 ; 3.9,-2 3.4,-2
Mechanical 14:
  lines w0.1: -5.208,4.905 5.192,4.905 ; -3.871,1.475 -3.871,-2.225 -2.929,-2.225 -2.929,1.475 ; -0.471,1.475 -0.471,-2.225 0.471,-2.225 0.471,1.475 ; 2.929,1.475 2.929,-2.225 3.871,-2.225 3.871,1.475 ; -5.208,1.475 -5.208,6.275 5.192,6.275 5.192,1.475 -5.208,1.475
3D body "ST_PENTAWATT-V.stp": height 20.85, standoff -4.55, extent -5.208,-2.225 5.192,6.275

## TEXAS_EBA (R-PSIP-T12) [mm] "TEXAS EBA (R-PSIP-T12) Case"
height 9.65
pads (12):
  round 1.6 hole 0.9: 1(-13.97,0) 2(-11.43,0) 3(-8.89,0) 4(-6.35,0) 5(-3.81,0) 6(-1.27,0) 7(1.27,0) 8(3.81,0) 9(6.35,0) 10(8.89,0) 11(11.43,0) 12(13.97,0)
Top Layer keep-out:
  lines w0.2: -15.365,1.06 15.365,1.06 15.365,5.84 -15.365,5.84 -15.365,1.06
Top Overlay:
  lines w0.2: -21.715,3.91 -8.65,3.91 ccw(c-8.65,6.31) -6.25,6.31 -6.25,11.51 cw(c-3.85,11.51) -3.85,13.91 3.85,13.91 cw(c3.85,11.51) 6.25,11.51 6.25,6.31 ccw(c8.65,6.31) 8.65,3.91 21.715,3.91 ; -20.915,3.91 -20.915,17.22 20.915,17.22 20.915,3.91 ; -20.915,4.77 -20.25,4.77 ; -20.915,6.07 -20.25,6.07 ; -20.915,15.62 -20.25,15.62 ; -20.515,1.51 -20.515,1.01 -19.515,1.01 -19.515,1.51 ; -20.25,3.91 -20.25,16.765 20.25,16.765 20.25,3.91 ; -18.315,16.765 -18.315,17.22 ; -14.47,1.091 -14.47,1.51 ; -13.47,1.091 -13.47,1.51 ; -11.93,1.091 -11.93,1.51 ; -10.93,1.091 -10.93,1.51 ; -9.39,1.091 -9.39,1.51 ; -8.39,1.091 -8.39,1.51 ; -6.85,1.091 -6.85,1.51 ; -5.85,1.091 -5.85,1.51 ; -4.31,1.091 -4.31,1.51 ; -3.31,1.091 -3.31,1.51 ; -1.77,1.091 -1.77,1.51 ; -0.77,1.091 -0.77,1.51 ; 0.77,1.091 0.77,1.51 ; 1.77,1.091 1.77,1.51 ; 3.31,1.091 3.31,1.51 ; 4.31,1.091 4.31,1.51 ; 5.85,1.091 5.85,1.51 ; 6.85,1.091 6.85,1.51 ; 8.39,1.091 8.39,1.51 ; 9.39,1.091 9.39,1.51 ; 10.93,1.091 10.93,1.51 ; 11.93,1.091 11.93,1.51 ; 13.47,1.091 13.47,1.51 ; 14.47,1.091 14.47,1.51 ; 18.315,16.765 18.315,17.22 ; 19.515,1.51 19.515,1.01 20.515,1.01 20.515,1.51 ; 20.25,4.77 20.915,4.77 ; 20.25,6.07 20.915,6.07 ; 20.25,15.62 20.915,15.62 ; -21.715,1.51 21.715,1.51 21.715,18.02 -21.715,18.02 -21.715,1.51
  text "1" at -16.756,-0.458 h1.2
Notvisible:
  lines w0.1: -14.47,0 -13.97,0 ; -13.97,-0.5 -13.97,0 ; -13.97,0.5 -13.97,0 ; -13.47,0 -13.97,0 ; -11.93,0 -11.43,0 ; -11.43,-0.5 -11.43,0 ; -11.43,0.5 -11.43,0 ; -10.93,0 -11.43,0 ; -9.39,0 -8.89,0 ; -8.89,-0.5 -8.89,0 ; -8.89,0.5 -8.89,0 ; -8.39,0 -8.89,0 ; -6.85,0 -6.35,0 ; -6.35,-0.5 -6.35,0 ; -6.35,0.5 -6.35,0 ; -5.85,0 -6.35,0 ; -4.31,0 -3.81,0 ; -3.81,-0.5 -3.81,0 ; -3.81,0.5 -3.81,0 ; -3.31,0 -3.81,0 ; -1.77,0 -1.27,0 ; -1.27,-0.5 -1.27,0 ; -1.27,0.5 -1.27,0 ; -0.77,0 -1.27,0 ; -0.5,0 0,0 ; 0,-0.5 0,0 ; 0,0.5 0,0 ; 0.5,0 0,0 ; 0.77,0 1.27,0 ; 1.27,-0.5 1.27,0 ; 1.27,0.5 1.27,0 ; 1.77,0 1.27,0 ; 3.31,0 3.81,0 ; 3.81,-0.5 3.81,0 ; 3.81,0.5 3.81,0 ; 4.31,0 3.81,0 ; 5.85,0 6.35,0 ; 6.35,-0.5 6.35,0 ; 6.35,0.5 6.35,0 ; 6.85,0 6.35,0 ; 8.39,0 8.89,0 ; 8.89,-0.5 8.89,0 ; 8.89,0.5 8.89,0 ; 9.39,0 8.89,0 ; 10.93,0 11.43,0 ; 11.43,-0.5 11.43,0 ; 11.43,0.5 11.43,0 ; 11.93,0 11.43,0 ; 13.47,0 13.97,0 ; 13.97,-0.5 13.97,0 ; 13.97,0.5 13.97,0 ; 14.47,0 13.97,0 ; -15.365,1.06 15.365,1.06 15.365,5.84 -15.365,5.84 -15.365,1.06
Mechanical 14:
  lines w0.1: -21.715,3.91 -8.65,3.91 ccw(c-8.65,6.31) -6.25,6.31 -6.25,11.51 cw(c-3.85,11.51) -3.85,13.91 3.85,13.91 cw(c3.85,11.51) 6.25,11.51 6.25,6.31 ccw(c8.65,6.31) 8.65,3.91 21.715,3.91 ; -20.915,3.91 -20.915,17.22 20.915,17.22 20.915,3.91 ; -20.915,4.77 -20.25,4.77 ; -20.915,6.07 -20.25,6.07 ; -20.915,15.62 -20.25,15.62 ; -20.515,1.51 -20.515,1.01 -19.515,1.01 -19.515,1.51 ; -20.25,3.91 -20.25,16.765 20.25,16.765 20.25,3.91 ; -18.315,16.765 -18.315,17.22 ; -14.47,1.51 -14.47,0.895 -14.185,0.61 -14.185,-0.215 -13.755,-0.215 -13.755,0.61 -13.47,0.895 -13.47,1.51 ; -11.93,1.51 -11.93,0.895 -11.645,0.61 -11.645,-0.215 -11.215,-0.215 -11.215,0.61 -10.93,0.895 -10.93,1.51 ; -9.39,1.51 -9.39,0.895 -9.105,0.61 -9.105,-0.215 -8.675,-0.215 -8.675,0.61 -8.39,0.895 -8.39,1.51 ; -6.85,1.51 -6.85,0.895 -6.565,0.61 -6.565,-0.215 -6.135,-0.215 -6.135,0.61 -5.85,0.895 -5.85,1.51 ; -4.31,1.51 -4.31,0.895 -4.025,0.61 -4.025,-0.215 -3.595,-0.215 -3.595,0.61 -3.31,0.895 -3.31,1.51 ; -1.77,1.51 -1.77,0.895 -1.485,0.61 -1.485,-0.215 -1.055,-0.215 -1.055,0.61 -0.77,0.895 -0.77,1.51 ; 0.77,1.51 0.77,0.895 1.055,0.61 1.055,-0.215 1.485,-0.215 1.485,0.61 1.77,0.895 1.77,1.51 ; 3.31,1.51 3.31,0.895 3.595,0.61 3.595,-0.215 4.025,-0.215 4.025,0.61 4.31,0.895 4.31,1.51 ; 5.85,1.51 5.85,0.895 6.135,0.61 6.135,-0.215 6.565,-0.215 6.565,0.61 6.85,0.895 6.85,1.51 ; 8.39,1.51 8.39,0.895 8.675,0.61 8.675,-0.215 9.105,-0.215 9.105,0.61 9.39,0.895 9.39,1.51 ; 10.93,1.51 10.93,0.895 11.215,0.61 11.215,-0.215 11.645,-0.215 11.645,0.61 11.93,0.895 11.93,1.51 ; 13.47,1.51 13.47,0.895 13.755,0.61 13.755,-0.215 14.185,-0.215 14.185,0.61 14.47,0.895 14.47,1.51 ; 18.315,16.765 18.315,17.22 ; 19.515,1.51 19.515,1.01 20.515,1.01 20.515,1.51 ; 20.25,4.77 20.915,4.77 ; 20.25,6.07 20.915,6.07 ; 20.25,15.62 20.915,15.62 ; -21.715,1.51 21.715,1.51 21.715,18.02 -21.715,18.02 -21.715,1.51
  text "1" at -16.756,-0.458 h1.2
Mechanical 15:
  lines w0.05: -22.475,-1.01 -22.475,18.8 22.475,18.8 22.475,-1.01 -22.475,-1.01
3D body "TEXAS_EBA (R-PSIP-T12).stp": height 9.65, standoff -3.26, extent -21.715,-0.215 21.715,18.02

## TEXAS_ECL (R-PDSS-T10) [mm] "Texas ECL (R-PDSS-T10)  Case"
height 8.5
pads (10):
  round 2.1 hole 1.4: 1(-7.935,6.355) 2(-7.935,1.275) 3(-7.935,-6.345) 4(4.765,-6.345) 5(7.935,-6.345) 6(7.935,-3.805) 7(7.935,-1.265) 8(7.935,1.275) 9(7.935,3.815) 10(7.935,6.355)
Top Overlay:
  lines w0.2: -9.46,-7.875 -9.46,7.875 9.46,7.875 9.46,-7.875 -9.46,-7.875
  text "1" at -6.216,5.852 h1.2
Notvisible:
  lines w0.1: -8.435,-6.345 -7.935,-6.345 ; -8.435,1.275 -7.935,1.275 ; -8.435,6.355 -7.935,6.355 ; -7.935,-6.845 -7.935,-6.345 ; -7.935,-5.845 -7.935,-6.345 ; -7.935,0.775 -7.935,1.275 ; -7.935,1.775 -7.935,1.275 ; -7.935,5.855 -7.935,6.355 ; -7.935,6.855 -7.935,6.355 ; -7.435,-6.345 -7.935,-6.345 ; -7.435,1.275 -7.935,1.275 ; -7.435,6.355 -7.935,6.355 ; -0.5,0 0,0 ; 0,-0.5 0,0 ; 0,0.5 0,0 ; 0.5,0 0,0 ; 4.265,-6.345 4.765,-6.345 ; 4.765,-6.845 4.765,-6.345 ; 4.765,-5.845 4.765,-6.345 ; 5.265,-6.345 4.765,-6.345 ; 7.435,-6.345 7.935,-6.345 ; 7.435,-3.805 7.935,-3.805 ; 7.435,-1.265 7.935,-1.265 ; 7.435,1.275 7.935,1.275 ; 7.435,3.815 7.935,3.815 ; 7.435,6.355 7.935,6.355 ; 7.935,-6.845 7.935,-6.345 ; 7.935,-5.845 7.935,-6.345 ; 7.935,-4.305 7.935,-3.805 ; 7.935,-3.305 7.935,-3.805 ; 7.935,-1.765 7.935,-1.265 ; 7.935,-0.765 7.935,-1.265 ; 7.935,0.775 7.935,1.275 ; 7.935,1.775 7.935,1.275 ; 7.935,3.315 7.935,3.815 ; 7.935,4.315 7.935,3.815 ; 7.935,5.855 7.935,6.355 ; 7.935,6.855 7.935,6.355 ; 8.435,-6.345 7.935,-6.345 ; 8.435,-3.805 7.935,-3.805 ; 8.435,-1.265 7.935,-1.265 ; 8.435,1.275 7.935,1.275 ; 8.435,3.815 7.935,3.815 ; 8.435,6.355 7.935,6.355
Mechanical 14:
  lines w0.1: -9.46,-7.875 -9.46,7.875 9.46,7.875 9.46,-7.875 -9.46,-7.875 ; -4.963,-3.774 -1.963,-3.774 -1.963,-0.774 -4.963,-0.774 -4.963,-3.774 ; -4.963,0.422 -1.963,0.422 -1.963,3.422 -4.963,3.422 -4.963,0.422 ; -4.963,4.361 -1.963,4.361 -1.963,7.361 -4.963,7.361 -4.963,4.361 ; -0.75,2.683 0.75,2.683 0.75,4.683 -0.75,4.683 -0.75,2.683 ; -0.75,5.572 0.75,5.572 0.75,7.072 -0.75,7.072 -0.75,5.572 ; 1.656,-4.966 cw(c3.314,-2.466) 1.656,0.034 4.972,0.034 cw(c3.314,-2.466) 4.972,-4.966 1.656,-4.966 ; 4.255,4.516 5.755,4.516 5.755,6.016 4.255,6.016 4.255,4.516
  text "1" at -6.216,5.852 h1.2
Mechanical 15:
  lines w0.05: -9.97,-8.38 -9.97,8.38 9.97,8.38 9.97,-8.38 -9.97,-8.38
3D body "TEXAS_ECL (R-PDSS-T10).stp": height 8.5, standoff -3.55, extent -9.46,-7.875 9.46,7.875